# Altium integrated library Integrated_Library1.IntLib: 1 symbol
Pins are listed as number, name and electrical type; pins without a type are passive.

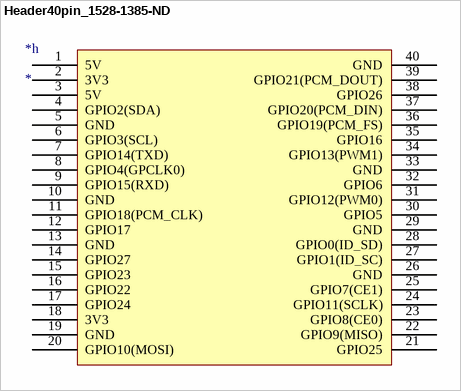
[diagram p0: symbol Header40pin_1528-1385-ND]

## Header40pin_1528-1385-ND
designator *h
footprint RHDR40W60P254_2X20_5100X500X2300P
pins: 1 5V, 2 3V3, 3 5V, 4 GPIO2(SDA), 5 GND, 6 GPIO3(SCL), 7 GPIO14(TXD), 8 GPIO4(GPCLK0), 9 GPIO15(RXD), 10 GND, 11 GPIO18(PCM_CLK), 12 GPIO17, 13 GND, 14 GPIO27, 15 GPIO23, 16 GPIO22, 17 GPIO24, 18 3V3, 19 GND, 20 GPIO10(MOSI), 21 GPIO25, 22 GPIO9(MISO), 23 GPIO8(CE0), 24 GPIO11(SCLK), 25 GPIO7(CE1), 26 GND, 27 GPIO1(ID_SC), 28 GPIO0(ID_SD), 29 GND, 30 GPIO5, 31 GPIO12(PWM0), 32 GPIO6, 33 GND, 34 GPIO13(PWM1), 35 GPIO16, 36 GPIO19(PCM_FS), 37 GPIO20(PCM_DIN), 38 GPIO26, 39 GPIO21(PCM_DOUT), 40 GND